# Altium footprint library Custom2.PcbLib: 99 footprints (part 6 of 7)
Each footprint in its own frame and in the unit in brackets; x right, y up, seen from the top. Pads: shape width x height; smd on the part's side, far side on the other; paste and mask are expansions set on the pad; w line width, h text height; cw(c..) or ccw(c..) is an arc to the next point about the centre after c.
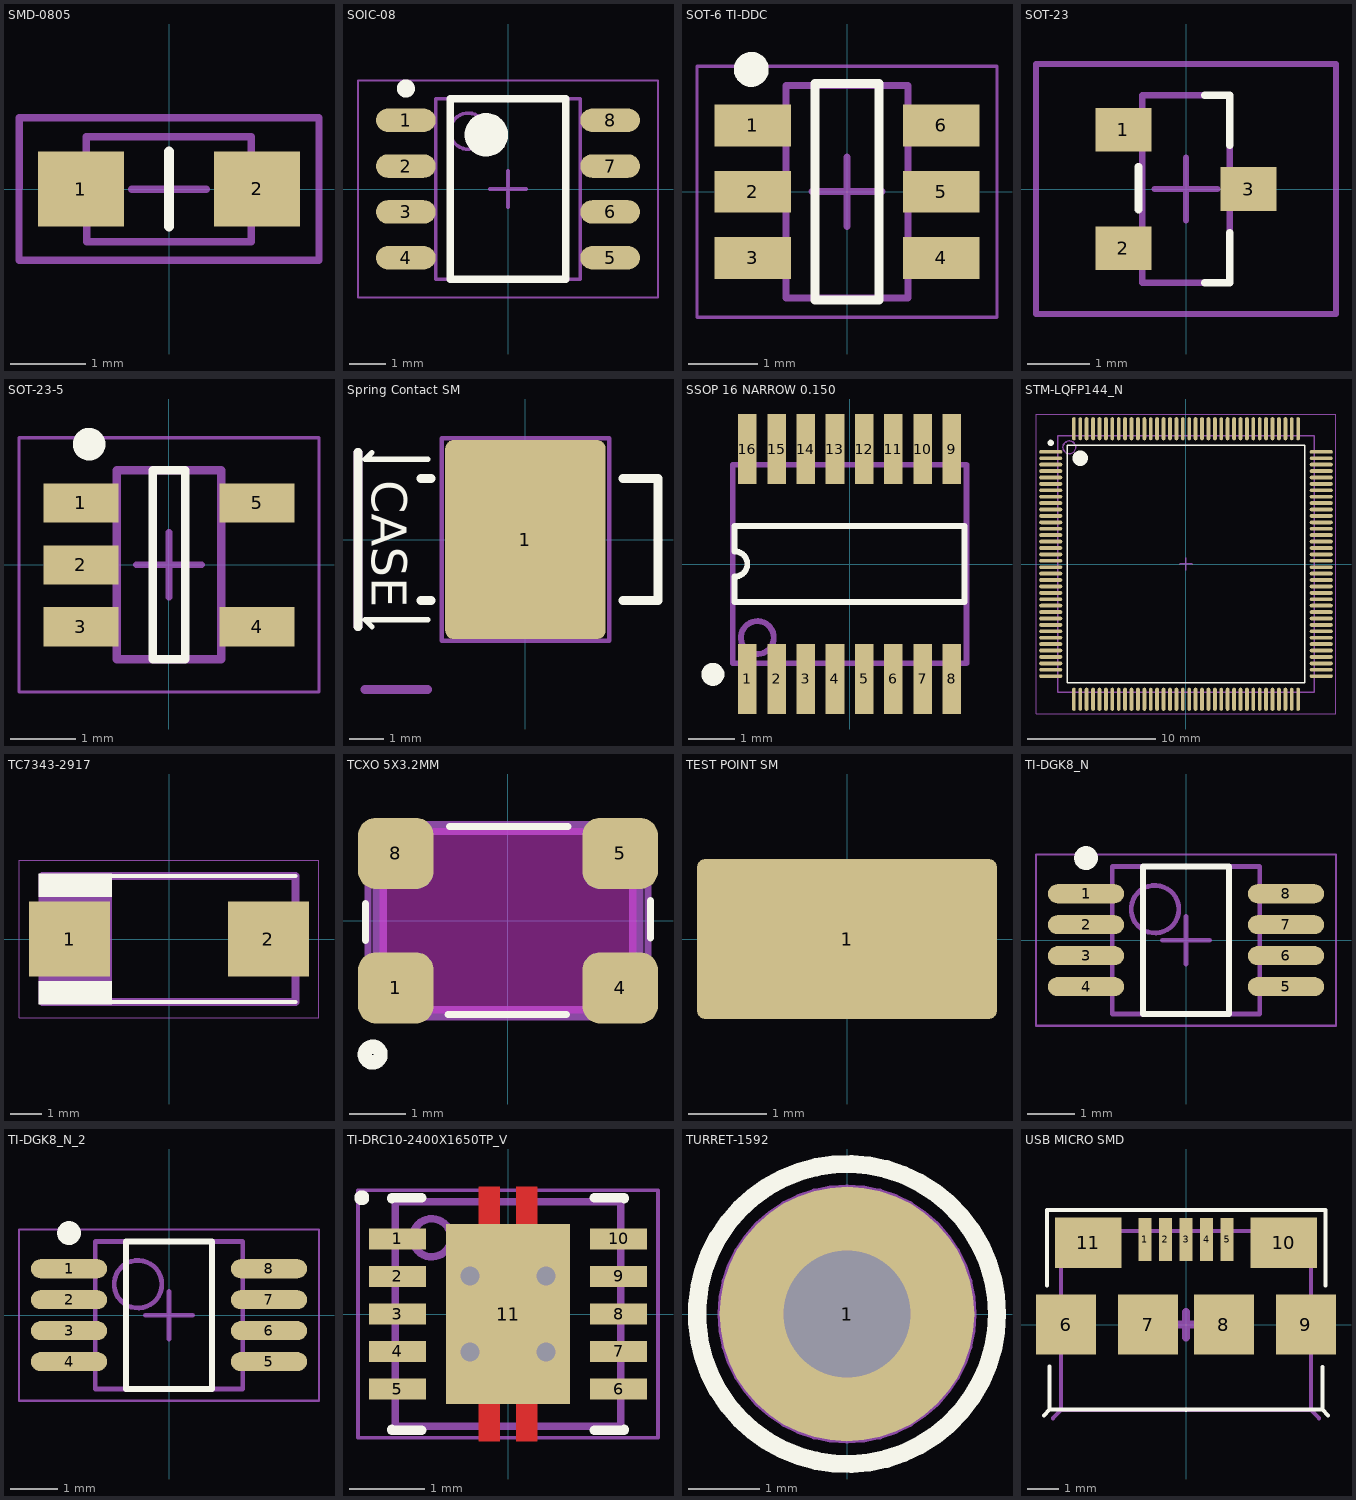
[diagram p5: the footprints below, top view; thin cyan lines are the x and y axes]

## SMD-0805 [mm]
pads (2):
  rect 1.15x1 smd: 1(-1.175,0) 2(1.175,0)
Top Overlay:
  lines w0.127: 0,0.5 0,-0.5 ; 0,-0.5 0,-0.5
Mechanical 13:
  lines w0.1: -1.1,-0.7 1.1,-0.7 1.1,0.7 -1.1,0.7 -1.1,-0.7
  text "'.Designator'" at 0.762,0.508 h0.76
Mechanical 15:
  lines w0.1: -0.5,0 0.5,0 ; 0,-0.5 0,0.5 ; -2,-0.95 2,-0.95 2,0.95 -2,0.95 -2,-0.95
3D body "74279201.stp": height 0.89, standoff -0.01, extent -1,-0.6 1,0.6

## SOIC-08 [mm] "SOIC, 8-Leads, Body 5x4mm, Pitch 1.27mm, IPC Low Density"
height 1.75
pads (8):
  oval 1.65x0.65 smd: 1(-2.825,1.905) 2(-2.825,0.635) 3(-2.825,-0.635) 4(-2.825,-1.905) 5(2.825,-1.905) 6(2.825,-0.635) 7(2.825,0.635) 8(2.825,1.905)
Top Overlay:
  circle w0.25: c-2.825,2.78 r0.125
  circle w0.6: c-0.6,1.5 r0.3
  lines w0.2: -1.6,-2.5 -1.6,2.5 1.6,2.5 1.6,-2.5 -1.6,-2.5
Mechanical 13:
  circle w0.1: c-1.1,1.6 r0.5
  lines w0.1: -2,-2.5 -2,2.5 2,2.5 2,-2.5 -2,-2.5
Mechanical 15:
  lines w0.05: -4.15,-3 -4.15,3 4.15,3 4.15,-3 -4.15,-3
  lines w0.1: -0.5,0 0.5,0 ; 0,-0.5 0,0.5
3D body "SOIC-8akaD0008AakaM08A.stp": height 1.63, standoff 0, extent -3,-2.45 3,2.45

## SOT-6 TI-DDC [mm]
pads (6):
  rect 1.1x0.6 smd: 1(-1.35,0.95) 2(-1.35,0) 3(-1.35,-0.95) 4(1.35,-0.95) 5(1.35,0) 6(1.35,0.95)
Top Overlay:
  circle w0.25: c-1.372,1.753 r0.125
  lines w0.127: -0.457,-1.55 0.457,-1.55 0.457,1.55 -0.457,1.55 -0.457,-1.55
Mechanical 13:
  lines w0.1: -0.875,-1.525 -0.875,1.525 0.875,1.525 0.875,-1.525 -0.875,-1.525
  text "'.Designator'" at 0.406,-1.245 h0.76
Mechanical 15:
  lines w0.05: -2.15,-1.8 -2.15,1.8 2.15,1.8 2.15,-1.8 -2.15,-1.8
  lines w0.1: -0.5,0 0.5,0 ; 0,-0.5 0,0.5
3D body: height 0.38, standoff 0, extent 1.016,-0.254 1.397,0.254
3D body: height 0.38, standoff 0, extent 1.016,-1.219 1.397,-0.711
3D body: height 0.38, standoff 0, extent 1.016,0.686 1.397,1.194
3D body: height 0.38, standoff 0, extent -1.397,0.711 -1.016,1.219
3D body: height 0.38, standoff 0, extent -1.397,-0.254 -1.016,0.254
3D body: height 0.38, standoff 0, extent -1.397,-1.219 -1.016,-0.711
3D body: height 1.27, standoff 0, extent -1.016,-1.524 1.016,1.524
3D body: height 1.28, standoff 1.27, extent -0.711,0.94 -0.407,1.243

## SOT-23 [mm]
pads (3):
  rect 0.9x0.7 smd: 1(-1,0.95) 2(-1,-0.95) 3(1,0)
Top Overlay:
  lines w0.127: -0.762,-0.33 -0.762,0.356 ; 0.3,-1.5 0.7,-1.5 0.7,-0.7 ; 0.3,1.5 0.7,1.5 0.7,0.7
Mechanical 13:
  lines w0.1: -0.7,-1.5 -0.7,1.5 0.7,1.5 0.7,-1.5 -0.7,-1.5
  text "'.Designator'" at -0.457,0.787 h0.76
Mechanical 15:
  lines w0.1: -0.5,0 0.5,0 ; 0,-0.5 0,0.5 ; -2.4,-2 -2.4,2 2.4,2 2.4,-2 -2.4,-2
3D body: height 0.76, standoff 0, extent -0.762,-1.397 0.762,1.397
3D body: height 0.38, standoff 0, extent 0.762,-0.254 1.143,0.254
3D body: height 0.38, standoff 0, extent -1.143,-1.219 -0.762,-0.711
3D body: height 0.38, standoff 0, extent -1.143,0.711 -0.762,1.219

## SOT-23-5 [mm]
pads (5):
  rect 1.15x0.6 smd: 1(-1.35,0.95) 2(-1.35,0) 3(-1.35,-0.95) 4(1.35,-0.95) 5(1.35,0.95)
Top Overlay:
  circle w0.25: c-1.225,1.85 r0.125
  lines w0.127: -0.25,-1.45 0.25,-1.45 0.25,1.45 -0.25,1.45 -0.25,-1.45
Mechanical 13:
  lines w0.127: -0.813,-1.062 -1.143,-1.062 -1.143,-0.808 -0.813,-0.808 ; -0.813,-0.112 -1.143,-0.112 -1.143,0.142 -0.813,0.142 ; -0.813,0.838 -1.143,0.838 -1.143,1.092 -0.813,1.092 ; 0.813,-1.092 1.143,-1.092 1.143,-0.838 0.813,-0.838 ; 0.813,0.808 1.143,0.808 1.143,1.062 0.813,1.062 ; -0.8,-1.45 -0.8,1.45 0.8,1.45 0.8,-1.45 -0.8,-1.45
  text "'.Designator'" at 0.505,-1.039 h0.76
Mechanical 15:
  lines w0.05: -2.3,-1.95 -2.3,1.95 2.3,1.95 2.3,-1.95 -2.3,-1.95
  lines w0.1: -0.5,0 0.5,0 ; 0,-0.5 0,0.5
3D body "SOT23-5.STEP": height 1.45, standoff 0, extent -1.4,-1.45 1.4,1.45

## Spring Contact SM [mm] "Harwin S1941- 42R"
pads (1):
  rrect10% 4.6x5.7 smd: 1(0,0)
Top Overlay:
  lines w0.15: -4.4,-2.5 -4.6,-2.3 -2.8,-2.3 ; -4.4,2.5 -4.6,2.3 -2.8,2.3
  lines w0.254: -4.8,-2.5 -4.8,2.5 ; -3,-1.75 -2.7,-1.75 ; -3,1.75 -2.7,1.75 ; 2.8,-1.75 3.8,-1.75 3.8,1.75 2.8,1.75
  text "CASE" at -4.4,1.7 h1
Mechanical 13:
  lines w0.127: -2.4,-2.9 2.4,-2.9 2.4,2.9 -2.4,2.9 -2.4,-2.9
  lines w0.254: -4.8,-2.5 -4.8,2.5 ; -4.6,-4.3 -2.8,-4.3
  text "'.Designator'" at 1.473,-0.965 h0.76
  text "CASE" at -4.4,1.7 h1
3D body "s1941-42.stp": height 7.26, standoff 0.01, extent -5.786,-2.85 3.8,2.85

## SSOP 16 NARROW 0.150 [mil]
pads (16):
  rect 16x60 smd paste-2 mask+3: 1(-87.5,-98.43) 2(-62.5,-98.43) 3(-37.5,-98.43) 4(-12.5,-98.43) 5(12.5,-98.43) 6(37.5,-98.43) 7(62.5,-98.43) 8(87.5,-98.43) 9(87.5,98.43) 10(62.5,98.43) 11(37.5,98.43) 12(12.5,98.43) 13(-12.5,98.43) 14(-37.5,98.43) 15(-62.5,98.43) 16(-87.5,98.43)
Top Overlay:
  circle w9.84: c-117.03,-94.49 r4.92
  lines w5: -98.42,-32.48 98.42,-32.48 98.42,32.48 -98.42,32.48 -98.42,10.83 cw(c-98.42,0) -98.42,-10.83 -98.42,-32.48
Mechanical 13:
  circle w5: c-79,-63 r14.1
  lines w5: -100,-85 100,-85 100,85 -100,85 -100,-85
  text "'.Designator'" at 18,-30 h30
3D body: height 15, standoff 0, extent 82,85 93,112
3D body: height 15, standoff 0, extent 57.5,85 68.5,112
3D body: height 15, standoff 0, extent 32.5,85 43.5,112
3D body: height 15, standoff 0, extent 7.5,85 18.5,112
3D body: height 15, standoff 0, extent -17.5,85 -6.5,112
3D body: height 15, standoff 0, extent -42.5,85 -31.5,112
3D body: height 15, standoff 0, extent -67.5,85 -56.5,112
3D body: height 15, standoff 0, extent -92.5,85 -81.5,112
3D body: height 15, standoff 0, extent 81.5,-112 92.5,-85
3D body: height 15, standoff 0, extent 56.5,-112 67.5,-85
3D body: height 15, standoff 0, extent 31.5,-112 42.5,-85
3D body: height 15, standoff 0, extent 6.5,-112 17.5,-85
3D body: height 15, standoff 0, extent -18.5,-112 -7.5,-85
3D body: height 15, standoff 0, extent -43.5,-112 -32.5,-85
3D body: height 15, standoff 0, extent -68.5,-112 -57.5,-85
3D body: height 15, standoff 0, extent -93,-112 -82,-85
3D body: height 60, standoff 0, extent -100,-85 100,85
3D body: height 61, standoff 60, extent -89.96,-71 -70,-51.08

## STM-LQFP144_N [mm]
pads (144):
  oval 1.8x0.3 smd: 1(-10.55,8.75) 2(-10.55,8.25) 3(-10.55,7.75) 4(-10.55,7.25) 5(-10.55,6.75) 6(-10.55,6.25) 7(-10.55,5.75) 8(-10.55,5.25) 9(-10.55,4.75) 10(-10.55,4.25) 11(-10.55,3.75) 12(-10.55,3.25) 13(-10.55,2.75) 14(-10.55,2.25) 15(-10.55,1.75) 16(-10.55,1.25) 17(-10.55,0.75) 18(-10.55,0.25) 19(-10.55,-0.25) 20(-10.55,-0.75) 21(-10.55,-1.25) 22(-10.55,-1.75) 23(-10.55,-2.25) 24(-10.55,-2.75) 25(-10.55,-3.25) 26(-10.55,-3.75) 27(-10.55,-4.25) 28(-10.55,-4.75) 29(-10.55,-5.25) 30(-10.55,-5.75) 31(-10.55,-6.25) 32(-10.55,-6.75) 33(-10.55,-7.25) 34(-10.55,-7.75) 35(-10.55,-8.25) 36(-10.55,-8.75) 73(10.55,-8.75) 74(10.55,-8.25) 75(10.55,-7.75) 76(10.55,-7.25) 77(10.55,-6.75) 78(10.55,-6.25) 79(10.55,-5.75) 80(10.55,-5.25) 81(10.55,-4.75) 82(10.55,-4.25) 83(10.55,-3.75) 84(10.55,-3.25) 85(10.55,-2.75) 86(10.55,-2.25) 87(10.55,-1.75) 88(10.55,-1.25) 89(10.55,-0.75) 90(10.55,-0.25) 91(10.55,0.25) 92(10.55,0.75) 93(10.55,1.25) 94(10.55,1.75) 95(10.55,2.25) 96(10.55,2.75) 97(10.55,3.25) 98(10.55,3.75) 99(10.55,4.25) 100(10.55,4.75) 101(10.55,5.25) 102(10.55,5.75) 103(10.55,6.25) 104(10.55,6.75) 105(10.55,7.25) 106(10.55,7.75) 107(10.55,8.25) 108(10.55,8.75)
  oval 0.3x1.8 smd: 37(-8.75,-10.55) 38(-8.25,-10.55) 39(-7.75,-10.55) 40(-7.25,-10.55) 41(-6.75,-10.55) 42(-6.25,-10.55) 43(-5.75,-10.55) 44(-5.25,-10.55) 45(-4.75,-10.55) 46(-4.25,-10.55) 47(-3.75,-10.55) 48(-3.25,-10.55) 49(-2.75,-10.55) 50(-2.25,-10.55) 51(-1.75,-10.55) 52(-1.25,-10.55) 53(-0.75,-10.55) 54(-0.25,-10.55) 55(0.25,-10.55) 56(0.75,-10.55) 57(1.25,-10.55) 58(1.75,-10.55) 59(2.25,-10.55) 60(2.75,-10.55) 61(3.25,-10.55) 62(3.75,-10.55) 63(4.25,-10.55) 64(4.75,-10.55) 65(5.25,-10.55) 66(5.75,-10.55) 67(6.25,-10.55) 68(6.75,-10.55) 69(7.25,-10.55) 70(7.75,-10.55) 71(8.25,-10.55) 72(8.75,-10.55) 109(8.75,10.55) 110(8.25,10.55) 111(7.75,10.55) 112(7.25,10.55) 113(6.75,10.55) 114(6.25,10.55) 115(5.75,10.55) 116(5.25,10.55) 117(4.75,10.55) 118(4.25,10.55) 119(3.75,10.55) 120(3.25,10.55) 121(2.75,10.55) 122(2.25,10.55) 123(1.75,10.55) 124(1.25,10.55) 125(0.75,10.55) 126(0.25,10.55) 127(-0.25,10.55) 128(-0.75,10.55) 129(-1.25,10.55) 130(-1.75,10.55) 131(-2.25,10.55) 132(-2.75,10.55) 133(-3.25,10.55) 134(-3.75,10.55) 135(-4.25,10.55) 136(-4.75,10.55) 137(-5.25,10.55) 138(-5.75,10.55) 139(-6.25,10.55) 140(-6.75,10.55) 141(-7.25,10.55) 142(-7.75,10.55) 143(-8.25,10.55) 144(-8.75,10.55)
Top Overlay:
  circle w0.25: c-10.55,9.45 r0.125
  circle w0.6: c-8.25,8.25 r0.3
  lines w0.127: -9.25,-9.25 -9.25,9.25 9.25,9.25 9.25,-9.25 -9.25,-9.25
Mechanical 13:
  circle w0.1: c-9.1,9.1 r0.5
  lines w0.1: -10,-10 -10,10 10,10 10,-10 -10,-10
  text "'.Designator'" at -3.073,-0.508 h0.76
Mechanical 15:
  lines w0.05: -11.7,-11.7 -11.7,11.7 11.7,11.7 11.7,-11.7 -11.7,-11.7
  lines w0.1: -0.5,0 0.5,0 ; 0,-0.5 0,0.5
3D body: height 1.6, standoff 0.05, extent -10,-10 10,10
3D body: height 1.78, standoff 1.75, extent -9.219,8.484 -8.459,9.243

## TC7343-2917 [mm]
pads (2):
  rect 2.6x2.4 smd: 1(-3.2,0) 2(3.2,0)
Top Overlay:
  rectangle: -4.191,-2.108 -1.829,-1.346
  rectangle: -4.191,1.346 -1.829,2.108
  lines w0.127: -4.064,-2.032 4.064,-2.032 ; -4.064,2.032 4.064,2.032
Mechanical 13:
  rectangle: -4.064,-2.108 -1.829,2.032
  lines w0.254: -4.064,-2.032 4.064,-2.032 4.064,2.032 -4.064,2.032 -4.064,-2.032
  text "'.Designator'" at 2.261,0.457 h0.76
Mechanical 15:
  lines w0.025: -4.826,-2.54 -4.826,2.54 4.826,2.54 4.826,-2.54 -4.826,-2.54
3D body: height 2.01, standoff 0.05, extent -4.064,-2.032 4.064,2.032

## TCXO 5X3.2MM [mm]
pads (4):
  rrect50% 1.35x1.27 smd: 1(-2,-1.2) 4(2,-1.2) 5(2,1.2) 8(-2,1.2)
Top Overlay:
  circle w0.254: c-2.413,-2.388 r0.141
  lines w0.127: -2.54,-0.356 -2.54,0.305 ; -1.067,-1.676 1.041,-1.676 ; -1.041,1.676 1.067,1.676 ; 2.54,-0.305 2.54,0.356
Keep-Out Layer:
  region: -2.286,-1.651 2.286,-1.651 2.286,1.651 -2.286,1.651
Top 3D Body:
  lines w0.254: -2.286,-1.651 2.286,-1.651 2.286,1.651 -2.286,1.651 -2.286,-1.651
Mechanical 13:
  circle w0.127: c-2,-1.2 r0.152
  lines w0.127: -2.5,1.6 2.5,1.6 2.5,-1.6 2.5,-1.6 -2.5,-1.6 -2.5,1.6 ; -2.5,1.6 -2.5,1.6
  text "'.Designator'" at 1.549,0.787 h0.76
3D body: height 2, standoff 0, extent -2.5,-1.905 2.5,1.905

## TEST POINT SM [mil]
pads (1):
  rrect10% 150x80 smd: 1(0,0)
Mechanical 13:
  lines w5: -52.5,-20 52.5,-20 52.5,20 -52.5,20 -52.5,-20
  text "'.Designator'" at 58,-38 h30
3D body: height 1, standoff 0, extent -75,-40 75,40
3D body "keystone_5015.step": height 60.48, standoff 0.48, extent -52.5,-20 52.5,20

## TI-DGK8_N [mm]
pads (8):
  oval 1.6x0.4 smd: 1(-2.1,0.975) 2(-2.1,0.325) 3(-2.1,-0.325) 4(-2.1,-0.975) 5(2.1,-0.975) 6(2.1,-0.325) 7(2.1,0.325) 8(2.1,0.975)
Top Overlay:
  circle w0.25: c-2.1,1.725 r0.125
  lines w0.127: -0.9,-1.55 0.9,-1.55 0.9,1.55 -0.9,1.55 -0.9,-1.55
Mechanical 13:
  circle w0.1: c-0.65,0.65 r0.5
  lines w0.1: -1.55,-1.55 1.55,-1.55 1.55,1.55 -1.55,1.55 -1.55,-1.55
  text "'.Designator'" at 0.126,1.042 h0.76
Mechanical 15:
  lines w0.05: -3.15,-1.8 3.15,-1.8 3.15,1.8 -3.15,1.8 -3.15,-1.8
  lines w0.1: -0.5,0 0.5,0 ; 0,-0.5 0,0.5
3D body: height 0.51, standoff 0, extent 1.549,-1.118 2.057,-0.864
3D body: height 0.51, standoff 0, extent -2.007,-1.118 -1.499,-0.864
3D body: height 0.51, standoff 0, extent 1.549,-0.457 2.057,-0.203
3D body: height 0.51, standoff 0, extent -2.007,-0.457 -1.499,-0.203
3D body: height 0.51, standoff 0, extent 1.549,0.203 2.057,0.457
3D body: height 0.51, standoff 0, extent -2.007,0.203 -1.499,0.457
3D body: height 1.1, standoff 1.08, extent -1.245,0.764 -0.737,1.27
3D body: height 0.51, standoff 0, extent -2.007,0.864 -1.499,1.118
3D body: height 1.09, standoff 0, extent -1.499,-1.524 1.549,1.524
3D body: height 0.51, standoff 0, extent 1.549,0.864 2.057,1.118

## TI-DGK8_N_2 [mm]
pads (8):
  oval 1.6x0.4 smd: 1(-2.1,0.975) 2(-2.1,0.325) 3(-2.1,-0.325) 4(-2.1,-0.975) 5(2.1,-0.975) 6(2.1,-0.325) 7(2.1,0.325) 8(2.1,0.975)
Top Overlay:
  circle w0.25: c-2.1,1.725 r0.125
  lines w0.127: -0.9,-1.55 -0.9,1.55 0.9,1.55 0.9,-1.55 -0.9,-1.55
Mechanical 13:
  circle w0.1: c-0.65,0.65 r0.5
  lines w0.1: -1.55,-1.55 -1.55,1.55 1.55,1.55 1.55,-1.55 -1.55,-1.55
  text "'.Designator'" at 1.118,-0.152 h0.76
Mechanical 15:
  lines w0.05: -3.15,-1.8 -3.15,1.8 3.15,1.8 3.15,-1.8 -3.15,-1.8
  lines w0.1: -0.5,0 0.5,0 ; 0,-0.5 0,0.5
3D body: height 0.51, standoff 0, extent 1.549,0.864 2.057,1.118
3D body: height 1.09, standoff 0, extent -1.499,-1.524 1.549,1.524
3D body: height 0.51, standoff 0, extent -2.007,0.864 -1.499,1.118
3D body: height 1.1, standoff 1.08, extent -1.245,0.764 -0.738,1.27
3D body: height 0.51, standoff 0, extent -2.007,0.203 -1.499,0.457
3D body: height 0.51, standoff 0, extent 1.549,0.203 2.057,0.457
3D body: height 0.51, standoff 0, extent -2.007,-0.457 -1.499,-0.203
3D body: height 0.51, standoff 0, extent 1.549,-0.457 2.057,-0.203
3D body: height 0.51, standoff 0, extent -2.007,-1.118 -1.499,-0.864
3D body: height 0.51, standoff 0, extent 1.549,-1.118 2.057,-0.864

## TI-DRC10-2400X1650TP_V [mm]
pads (11):
  rect 0.762x0.28 smd mask+0.076: 1(-1.475,1) 2(-1.475,0.5) 3(-1.475,0) 4(-1.475,-0.5) 5(-1.475,-1) 6(1.475,-1) 7(1.475,-0.5) 8(1.475,0) 9(1.475,0.5) 10(1.475,1)
  rect 1.65x2.4 smd paste-1.27: 11(0,0)
via 0.508,-0.508 diameter 0.508 hole 0.254
via 0.508,0.508 diameter 0.508 hole 0.254
via -0.508,-0.508 diameter 0.508 hole 0.254
via -0.508,0.508 diameter 0.508 hole 0.254
Top Layer:
  region: -0.11,1.2 -0.11,1.7 -0.39,1.7 -0.39,1.2
  region: 0.11,-1.2 0.11,-1.7 0.39,-1.7 0.39,-1.2
  region: -0.11,-1.2 -0.11,-1.7 -0.39,-1.7 -0.39,-1.2
  region: 0.11,1.2 0.11,1.7 0.39,1.7 0.39,1.2
Top Overlay:
  circle w0.1: c-1.95,1.55 r0.05
  lines w0.127: -1.55,-1.54 -1.55,-1.55 -1.15,-1.55 ; -1.55,1.54 -1.55,1.55 -1.15,1.55 ; 1.15,-1.55 1.55,-1.55 1.55,-1.54 ; 1.15,1.55 1.55,1.55 1.55,1.54
Top Paste:
  region: -0.212,-0.387 0.013,-0.562 0.238,-0.387 0.238,0.062 0.238,0.387 0.013,0.563 -0.212,0.387
  region: -0.8,0.225 -0.8,-0.225 0,-0.225 0.8,-0.225 0.8,0.225
  region: -0.8,-0.75 -0.8,-1.2 0,-1.2 0.8,-1.2 0.8,-0.75
  region: -0.8,1.2 -0.8,0.75 0,0.75 0.8,0.75 0.8,1.2
  region: -0.11,1.2 -0.11,1.7 -0.39,1.7 -0.39,1.2
  region: 0.11,-1.2 0.11,-1.7 0.39,-1.7 0.39,-1.2
  region: -0.11,-1.2 -0.11,-1.7 -0.39,-1.7 -0.39,-1.2
  region: 0.11,1.2 0.11,1.7 0.39,1.7 0.39,1.2
Mechanical 13:
  circle w0.1: c-1.016,1.016 r0.254
  lines w0.1: -1.5,-1.5 -1.5,1.5 1.5,1.5 1.5,-1.5 -1.5,-1.5
  text "'.Designator'" at 1.067,0.229 h0.76
Mechanical 15:
  lines w0.05: -2,-1.65 -2,1.65 2,1.65 2,-1.65 -2,-1.65
  lines w0.1: -0.5,0 0.5,0 ; 0,-0.5 0,0.5
3D body: height 1, standoff 0, extent -1.5,-1.5 1.5,1.5
3D body: height 1.02, standoff 0.99, extent -1.245,0.788 -0.737,1.294

## TURRET-1592 [mil]
pads (1):
  round 140 / inner round 140 / far side round 110 hole 70: 1(0,0)
Top Overlay:
  circle w10: c0,0 r82.46
Mechanical 13:
  circle w5: c0,0 r68.73
  circle w5: c0,0 r34.13
  text "'.Designator'" at -49,81 h30
3D body "mill-max-2506-2-00-01-00-00-07-0.step": height 156.5, standoff -83.54, extent -62.49,-62.49 62.59,62.51

## USB MICRO SMD [mm]
pads (11):
  rect 0.4x1.35 smd: 1(-1.3,2.7) 2(-0.65,2.7) 3(0,2.7) 4(0.65,2.7) 5(1.3,2.7)
  rect 1.9x1.9 smd: 6(-3.8,0) 7(-1.2,0) 8(1.2,0) 9(3.8,0)
  rect 2.1x1.6 smd: 10(3.1,2.6) 11(-3.1,2.6)
Top Overlay:
  lines w0.127: -4.496,-2.87 -4.318,-2.692 ; -4.394,1.245 -4.394,3.632 4.42,3.632 4.42,1.245 ; -4.318,-1.321 -4.318,-2.692 ; 4.318,-1.346 4.318,-2.692 ; 4.496,-2.87 4.318,-2.692 ; -4.318,-2.692 -0.007,-2.692 0,-2.7 0.007,-2.692 4.318,-2.692
Mechanical 13:
  lines w0.127: -4.216,-2.972 -4.216,-2.96 -3.956,-2.7 ; 4.216,-2.972 4.216,-2.96 3.956,-2.7 ; -3.956,-2.7 ccw(c-3.956,-2.7) -3.956,-2.7 ; -3.956,-2.7 ccw(c-3.956,-2.7) -3.956,-2.7 ; -3.956,-2.7 3.956,-2.7 ; -3.956,-2.7 -3.956,2.961 ; -3.956,2.961 ccw(c-3.956,2.961) -3.956,2.961 ; -3.956,2.961 3.956,2.961 ; 3.956,-2.7 ccw(c3.956,-2.7) 3.956,-2.7 ; 3.956,-2.7 3.956,2.961 ; 3.956,2.961 ccw(c3.956,2.961) 3.956,2.961
  text "'.Designator'" at -1.676,3.353 h0.76
Mechanical 15:
  lines w0.254: -0.4,0 0.4,0 ; 0,-0.4 0,0.4
3D body "10118192C.stp": height 2.69, standoff -0.32, extent -3.956,-2.7 3.956,2.961